# Altium footprint library Mine.PcbLib: 306 footprints (part 12 of 20)
Each footprint in its own frame and in the unit in brackets; x right, y up, seen from the top. Pads: shape width x height; smd on the part's side, far side on the other; paste and mask are expansions set on the pad; w line width, h text height; cw(c..) or ccw(c..) is an arc to the next point about the centre after c.
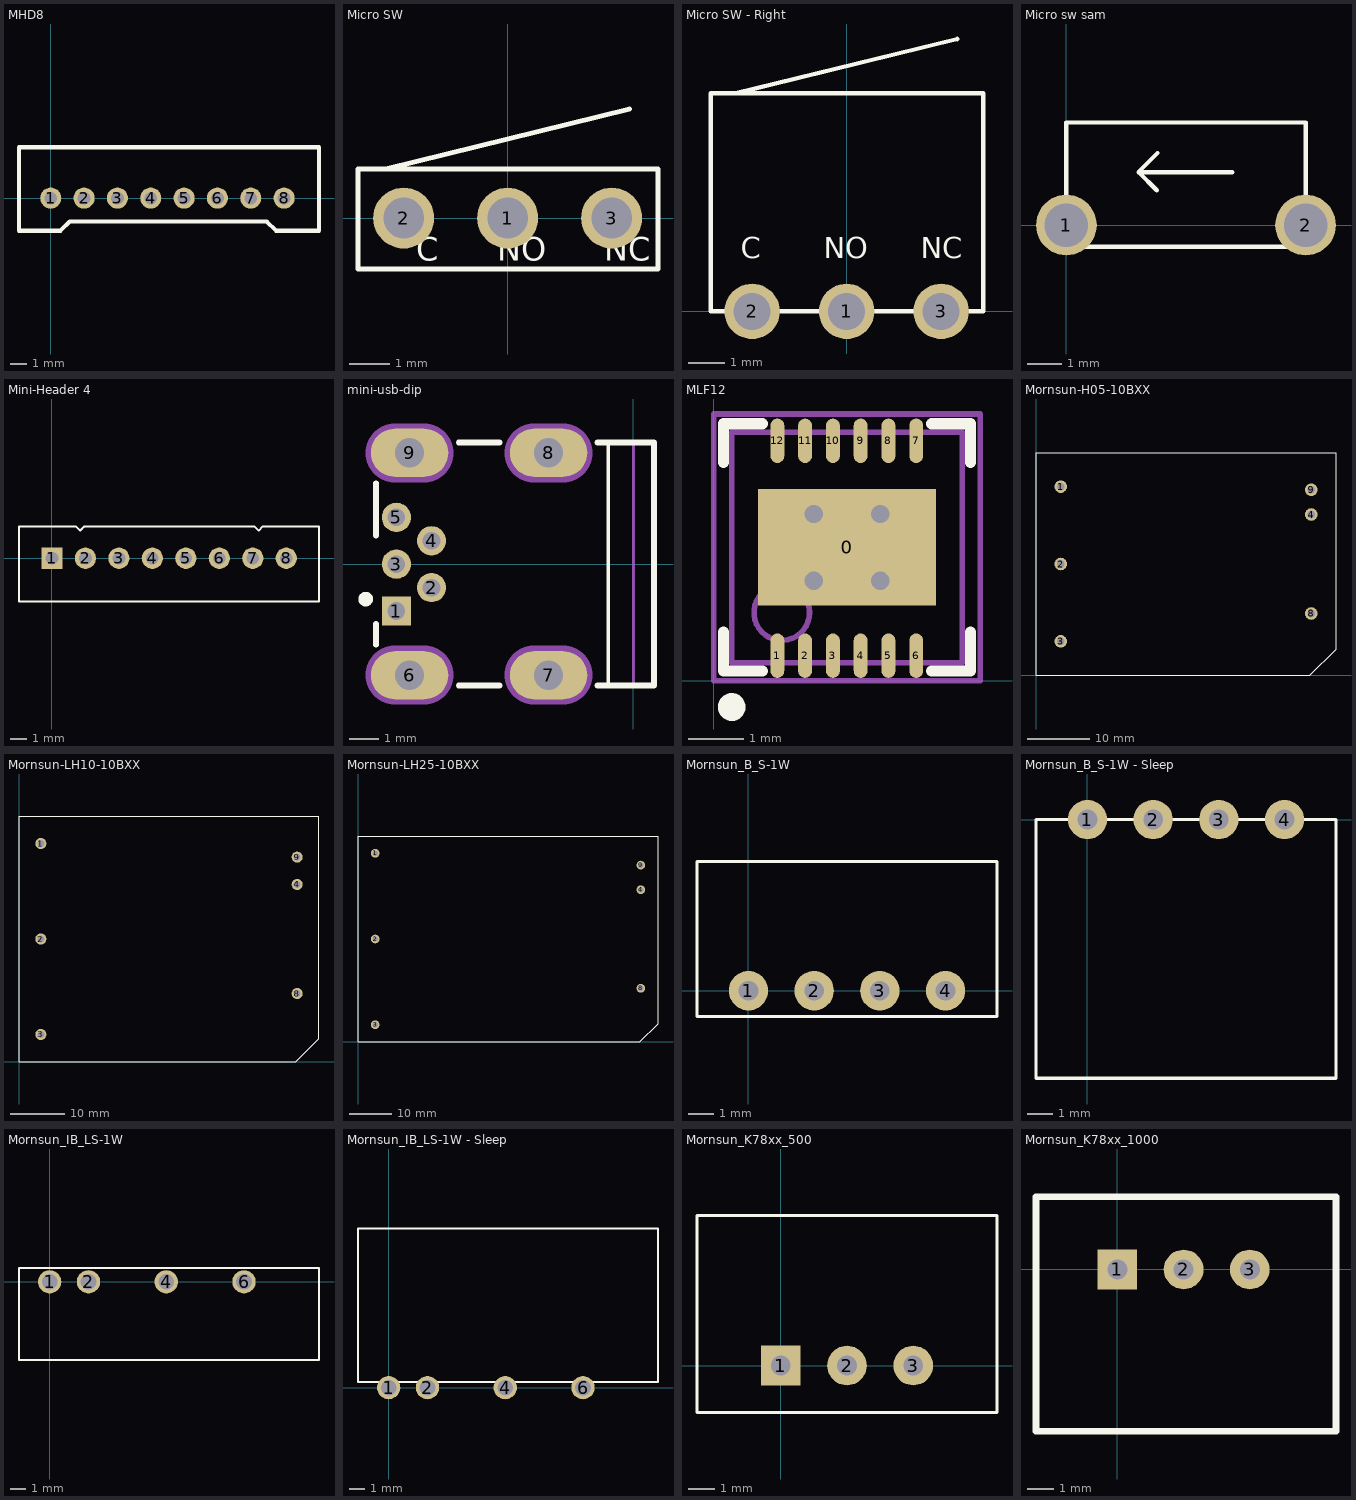
[diagram p11: the footprints below, top view; thin cyan lines are the x and y axes]

## MHD8 [mil] "Miniature"
height 236.22
pads (8):
  round 50 hole 30: 1(0,0) 2(78.74,0) 3(157.48,0) 4(236.22,0) 5(314.96,0) 6(393.7,0) 7(472.44,0) 8(551.18,0)
Top Overlay:
  lines w10: -75,-76.85 23.15,-76.85 45,-55 510,-55 531.85,-76.85 633.66,-76.85 633.66,120 -75,120 -75,-76.85

## Micro SW [mil]
height 196.85
pads (3):
  round 60 hole 40: 1(0,0) 2(-102.36,0) 3(102.36,0)
Top Overlay:
  lines w5: -120,48.43 120,107.2 ; -147.28,-50 -147.28,48.43 147.99,48.43 148,-50 -147.28,-50
  text "C" at -90,-50 h39.37
  text "NO" at -10,-50 h39.37
  text "NC" at 95,-50 h39.37

## Micro SW - Right [mil]
height 98.43
pads (3):
  round 60 hole 40: 1(0,0) 2(-102.36,0) 3(102.36,0)
Top Overlay:
  lines w5: -120,236.22 120,295 ; -147.28,0 -147.28,236.22 148,236.22 148,0 -147.28,0
  text "C" at -115,50 h39.37
  text "NO" at -25,50 h39.37
  text "NC" at 80,50 h39.37

## Micro sw sam [mil]
height 196.85
pads (2):
  round 70 hole 50: 1(0,0) 2(275.59,0)
Top Overlay:
  lines w5: 104,40 83,61 ; 105,83 83,61 ; 191,61 83,61 ; 275.59,-24.59 275.59,0 ; 276,-25 0,-25 0,118.11 275.59,118.11 ; 275.59,0 275.59,0 ; 275.59,0 275.59,118.11 ; 275.59,118.11 275.59,118.11

## Mini-Header 4 [mil]
pads (8):
  rect 50x50 hole 30: 1(0,0)
  round 50 hole 30: 2(78.74,0) 3(157.48,0) 4(236.22,0) 5(314.96,0) 6(393.7,0) 7(472.44,0) 8(551.18,0)
Top Overlay:
  lines w5: -77.48,-102.17 628.18,-102.17 628.18,75 496.18,75 486.18,65 476.18,75 76.18,75 73.68,72.5 68.68,67.5 66.18,65 56.18,75 -77.48,75 -77.48,-102.17

## mini-usb-dip [mm] "Connector; IEEE1394, Thru-Hole; 4 Position; Vertical"
height 9.7
pads (9):
  rect 1x1 hole 0.6: 1(-8.1,-1.606)
  round 1 hole 0.6: 2(-6.9,-0.806) 3(-8.1,-0.006) 4(-6.9,0.794) 5(-8.1,1.594)
  oval 2.65x1.65 hole 1: 6(-7.65,-3.799) 7(-2.9,-3.799) 8(-2.9,3.801) 9(-7.65,3.801)
Top Overlay:
  circle w0.25: c-9.151,-1.199 r0.125
  lines w0.127: -0.864,-4.149 -0.864,4.151
  lines w0.2: -8.8,-2.759 -8.8,-2.049 ; -8.8,0.971 -8.8,2.761 ; -5.97,-4.149 -4.58,-4.149 ; -5.97,4.151 -4.58,4.151 ; -1.23,-4.149 0.702,-4.149 0.702,4.151 -1.23,4.151
Mechanical 1:
  lines w0.1: 0,-4.149 0,4.151
  lines w1: -8.15,-3.799 -7.15,-3.799 ; -8.15,3.801 -7.15,3.801 ; -3.4,-3.799 -2.4,-3.799 ; -3.4,3.801 -2.4,3.801
  text "Mech 2 - Clearance, move to internal plane if present" at -9.5,5.071 h0.3
  text "Alert PCB fab to slot details" at -9.5,6.571 h0.3
  text "Slot 1x2mm, PTH" at -9.5,6.071 h0.3
  text "Assign keep-out area to slot" at -9.5,7.071 h0.3
  text "Mech 1 - Slot cut-out" at -9.5,5.571 h0.3
  text "PCB Edge" at 0.37,-3.705 h0.25
Mechanical 2:
  lines w2.016: -8.15,-3.799 -7.15,-3.799 ; -8.15,3.801 -7.15,3.801 ; -3.4,-3.799 -2.4,-3.799 ; -3.4,3.801 -2.4,3.801

## MLF12 [mm] "4x4 12-Lead MLF"
height 1
pads (13):
  rect 3.2x2.1 smd: 0(2.4,2.4)
  oval 0.25x0.8 smd: 1(1.146,0.45) 2(1.646,0.45) 3(2.146,0.45) 4(2.646,0.45) 5(3.146,0.45) 6(3.646,0.45) 7(3.646,4.318) 8(3.146,4.318) 9(2.646,4.318) 10(2.146,4.318) 11(1.646,4.318) 12(1.146,4.318)
via 1.8,1.8 diameter 0.66 hole 0.33
via 1.8,3 diameter 0.66 hole 0.33
via 3,1.8 diameter 0.66 hole 0.33
via 3,3 diameter 0.66 hole 0.33
Top Overlay:
  circle w0.25: c0.325,-0.475 r0.125
  lines w0.2: 0.175,0.875 0.175,0.175 0.875,0.175 ; 0.175,3.925 0.175,4.625 0.875,4.625 ; 3.925,0.175 4.625,0.175 4.625,0.875 ; 3.925,4.625 4.625,4.625 4.625,3.925
Mechanical 13:
  circle w0.1: c1.225,1.225 r0.5
  lines w0.1: 0.325,0.325 4.475,0.325 4.475,4.475 0.325,4.475 0.325,0.325
Mechanical 15:
  lines w0.1: 1.9,2.4 2.9,2.4 ; 2.4,1.9 2.4,2.9 ; 0,0 4.8,0 4.8,4.8 0,4.8 0,0
3D body: height 1, standoff 0, extent 0.325,0.325 4.475,4.475

## Mornsun-H05-10BXX [mil]
height 807.09
pads (6):
  round 80 hole 50: 1(157.48,1200.79) 2(157.48,708.66) 3(157.48,216.54) 4(1751.97,1023.62) 8(1751.97,393.7) 9(1751.97,1181.1)
Top Overlay:
  lines w5: 0,0 1742.44,0 1909.45,167.01 1909.45,1417.32 0,1417.32 0,0

## Mornsun-LH10-10BXX [mil]
height 826.77
pads (6):
  round 80 hole 50: 1(157.48,1574.8) 2(157.48,885.83) 3(157.48,196.85) 4(2007.87,1279.53) 8(2007.87,492.13) 9(2007.87,1476.38)
Top Overlay:
  lines w5: 0,0 1998.35,0 2165.35,167.01 2165.35,1771.65 0,1771.65 0,0

## Mornsun-LH25-10BXX [mil]
height 925.2
pads (6):
  round 80 hole 50: 1(157.48,1732.28) 2(157.48,944.88) 3(157.48,157.48) 4(2598.43,1397.64) 8(2598.43,492.13) 9(2598.43,1624.02)
Top Overlay:
  lines w5: 0,0 0,1889.76 2755.91,1889.76 2755.91,167.01 2588.9,0 0,0

## Mornsun_B_S-1W [mil] "Mornsun isolated regulator"
height 393.7
pads (4):
  round 60 hole 30: 1(0,0) 2(100,0) 3(200,0) 4(300,0)
Top Overlay:
  lines w5: -78.35,-39.37 378.35,-39.37 378.35,196.85 -78.35,196.85 -78.35,-39.37

## Mornsun_B_S-1W - Sleep [mil] "Mornsun isolated regulator"
height 236.22
pads (4):
  round 60 hole 30: 1(0,0) 2(100,0) 3(200,0) 4(300,0)
Top Overlay:
  lines w5: -78.35,-393.7 378.35,-393.7 378.35,0 -78.35,0 -78.35,-393.7

## Mornsun_IB_LS-1W [mil]
height 374.02
pads (4):
  round 60 hole 40: 1(0,0) 2(100,0) 4(300,0) 6(500,0)
Top Overlay:
  lines w5: -78.74,-200.79 692.91,-200.79 692.91,35.43 -78.74,35.43 -78.74,-200.79

## Mornsun_IB_LS-1W - Sleep [mil]
height 236.22
pads (4):
  round 60 hole 40: 1(0,0) 2(100,0) 4(300,0) 6(500,0)
Top Overlay:
  lines w5: -78.74,15 -78.74,408.7 692.91,408.7 692.91,15 -78.74,15

## Mornsun_K78xx_500 [mil]
height 401.57
pads (3):
  rect 60x60 hole 30: 1(0,0)
  round 60 hole 30: 2(100,0) 3(200,0)
Top Overlay:
  lines w5: -126.38,-70.87 326.38,-70.87 326.38,226.38 -126.38,226.38 -126.38,-70.87

## Mornsun_K78xx_1000 [mil]
height 688.98
pads (3):
  rect 60x60 hole 30: 1(0,0)
  round 60 hole 30: 2(100,0) 3(200,0)
Top Overlay:
  lines w10: -122.76,-244.33 330,-244.33 330,110 -122.76,110 -122.76,-244.33